# Altium footprint library Flyback Transformers.PcbLib: 66 footprints (part 4 of 5)
Each footprint in its own frame and in the unit in brackets; x right, y up, seen from the top. Pads: shape width x height; smd on the part's side, far side on the other; paste and mask are expansions set on the pad; w line width, h text height; cw(c..) or ccw(c..) is an arc to the next point about the centre after c.
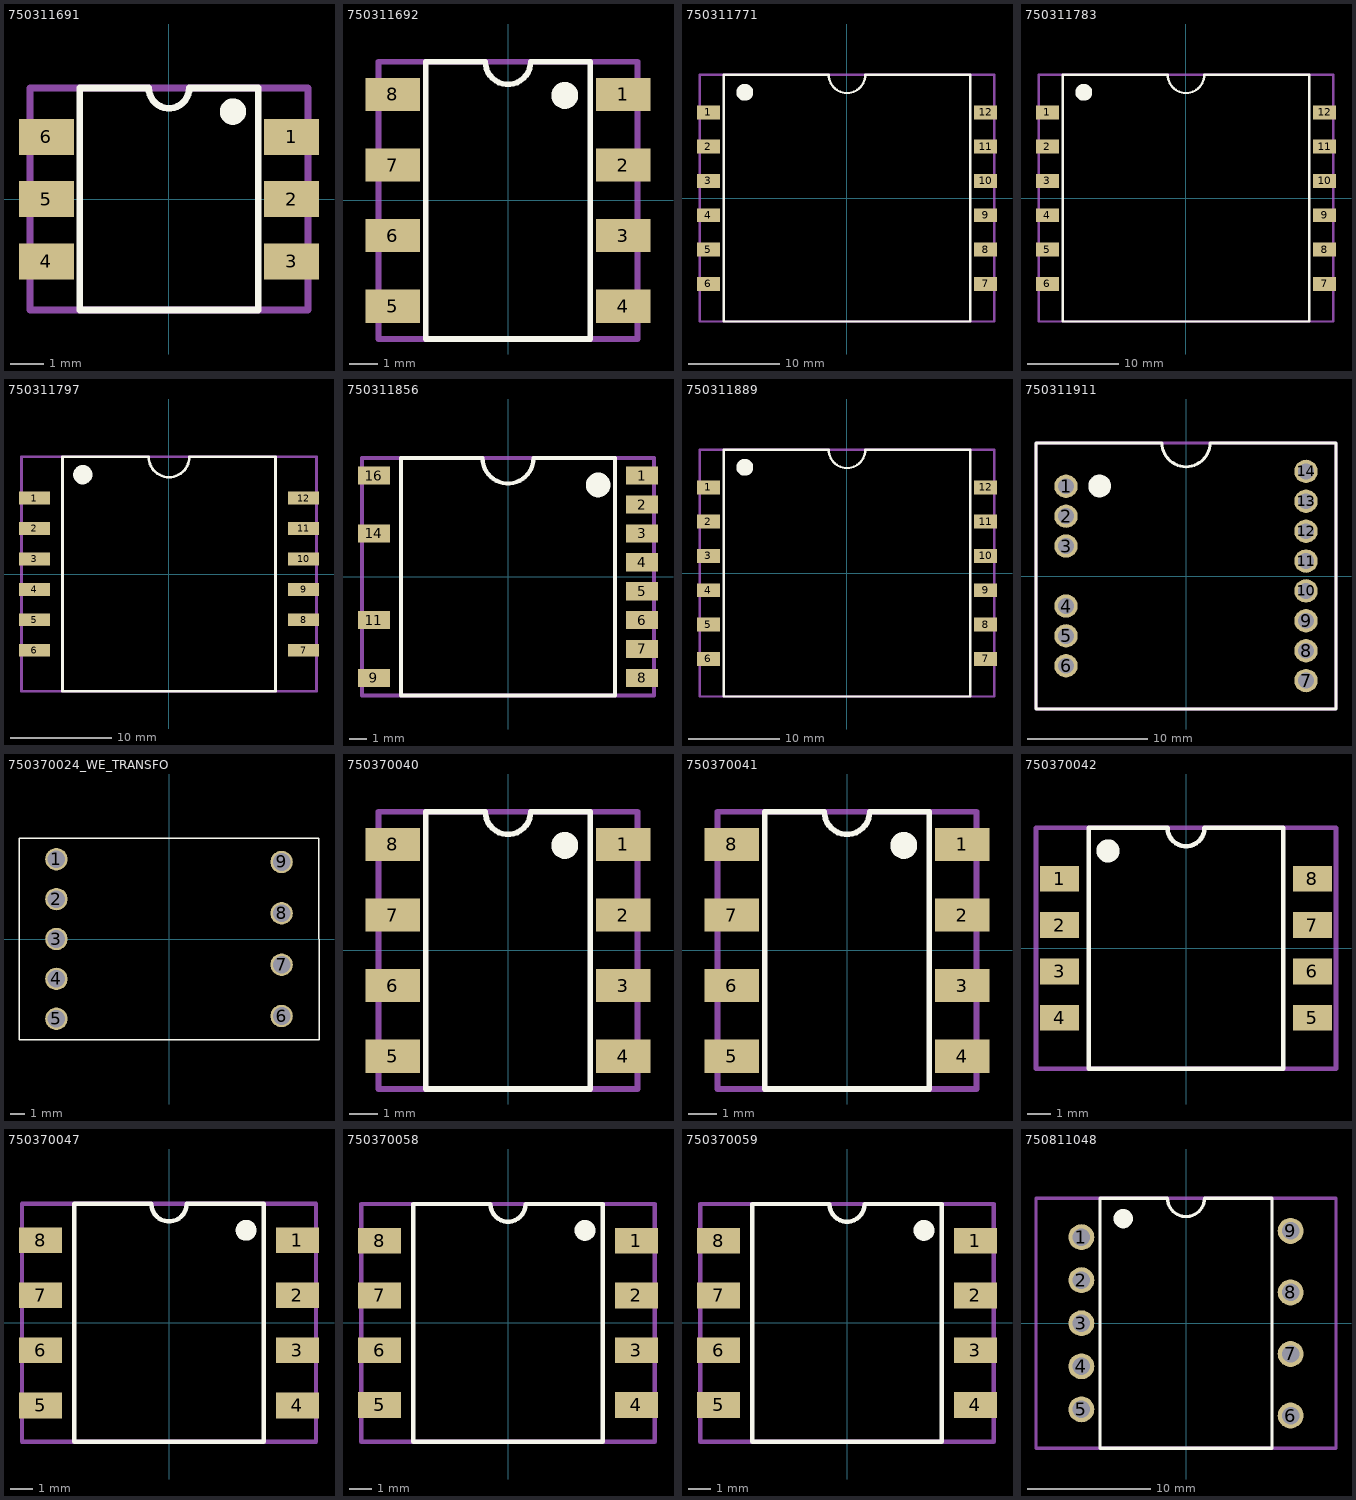
[diagram p3: the footprints below, top view; thin cyan lines are the x and y axes]

## 750311691 [mm] "Flyback Transformer, size EP5"
height 5.59
pads (6):
  rect 1.63x1.07 smd: 1(3.645,1.85) 2(3.645,0) 3(3.645,-1.85) 4(-3.645,-1.85) 5(-3.645,0) 6(-3.645,1.85)
Top Overlay:
  circle w0.5: c1.9,2.6 r0.141
  lines w0.2: -2.65,-3.3 2.65,-3.3 2.65,3.3 0.6,3.3 cw(c0,3.3) -0.6,3.3 -2.65,3.3 -2.65,-3.3
Mechanical 13:
  lines w0.2: -4.13,-3.3 4.13,-3.3 4.13,3.3 -4.13,3.3 -4.13,-3.3
3D body "STEP-750311691-rev1.stp": height 5.1, standoff 0, extent -3.85,-3.075 3.85,3.075

## 750311692 [mm] "Flyback Transformer, size EP7"
height 10.54
pads (8):
  rect 1.91x1.17 smd: 1(4.065,3.735) 2(4.065,1.245) 3(4.065,-1.245) 4(4.065,-3.735) 5(-4.065,-3.735) 6(-4.065,-1.245) 7(-4.065,1.245) 8(-4.065,3.735)
Top Overlay:
  circle w0.5: c2,3.7 r0.224
  lines w0.2: -2.9,-4.89 2.9,-4.89 2.9,4.89 0.8,4.89 cw(c0,4.89) -0.8,4.89 -2.9,4.89 -2.9,-4.89
Mechanical 13:
  lines w0.2: -4.57,-4.89 4.57,-4.89 4.57,4.89 -4.57,4.89 -4.57,-4.89
3D body "STEP-750311692-rev1.stp": height 10.55, standoff 0.01, extent -4.57,-4.89 4.57,4.89

## 750311771 [mm] "Flyback Transformer, size EFD25"
height 13.69
pads (12):
  rect 2.5x1.52 smd: 1(-15.19,9.4) 2(-15.19,5.64) 3(-15.19,1.88) 4(-15.19,-1.88) 5(-15.19,-5.64) 6(-15.19,-9.4) 7(15.19,-9.4) 8(15.19,-5.64) 9(15.19,-1.88) 10(15.19,1.88) 11(15.19,5.64) 12(15.19,9.4)
Top Overlay:
  circle w1: c-11.2,11.6 r0.424
  lines w0.254: -13.5,-13.515 -13.5,13.515 -2,13.515 ccw(c0,13.515) 2,13.515 13.5,13.515 13.5,-13.515 -13.5,-13.515
Mechanical 13:
  lines w0.254: -16.155,-13.515 16.155,-13.515 16.155,13.515 -16.155,13.515 -16.155,-13.515
3D body "STEP-750311771-rev1.stp": height 13.05, standoff 0.05, extent -15.75,-12.5 15.75,12.5

## 750311783 [mm] "Flyback Transformer, size EFD25"
height 13.69
pads (12):
  rect 2.5x1.52 smd: 1(-15.19,9.4) 2(-15.19,5.64) 3(-15.19,1.88) 4(-15.19,-1.88) 5(-15.19,-5.64) 6(-15.19,-9.4) 7(15.19,-9.4) 8(15.19,-5.64) 9(15.19,-1.88) 10(15.19,1.88) 11(15.19,5.64) 12(15.19,9.4)
Top Overlay:
  circle w1: c-11.2,11.6 r0.424
  lines w0.254: -13.5,-13.515 -13.5,13.515 -2,13.515 ccw(c0,13.515) 2,13.515 13.5,13.515 13.5,-13.515 -13.5,-13.515
Mechanical 13:
  lines w0.254: -16.155,-13.515 16.155,-13.515 16.155,13.515 -16.155,13.515 -16.155,-13.515
3D body "STEP-750311783-rev1.stp": height 13.05, standoff 0.05, extent -15.75,-12.5 15.75,12.5

## 750311797 [mm] "Flyback Transformer, size EFD20"
height 11.43
pads (12):
  rect 3.05x1.27 smd: 1(-13.26,7.5) 2(-13.26,4.5) 3(-13.26,1.5) 4(-13.26,-1.5) 5(-13.26,-4.5) 6(-13.26,-7.5) 7(13.26,-7.5) 8(13.26,-4.5) 9(13.26,-1.5) 10(13.26,1.5) 11(13.26,4.5) 12(13.26,7.5)
Top Overlay:
  circle w1: c-8.5,9.8 r0.447
  lines w0.254: -10.5,-11.555 -10.5,11.555 -2,11.555 ccw(c0,11.555) 2,11.555 10.5,11.555 10.5,-11.555 -10.5,-11.555
Mechanical 13:
  lines w0.254: -14.54,-11.555 14.54,-11.555 14.54,11.555 -14.54,11.555 -14.54,-11.555
3D body "STEP-750311797-rev1 (1).stp": height 11.45, standoff 0.02, extent -14.54,-10 14.54,10

## 750311856 [mm] "Flyback Transformer, size EP13"
height 12.7
pads (12):
  rect 1.88x1.07 smd: 1(7.885,5.95) 2(7.885,4.25) 3(7.885,2.55) 4(7.885,0.85) 5(7.885,-0.85) 6(7.885,-2.55) 7(7.885,-4.25) 8(7.885,-5.95) 9(-7.885,-5.95) 11(-7.885,-2.55) 14(-7.885,2.55) 16(-7.885,5.95)
Top Overlay:
  circle w1: c5.3,5.4 r0.224
  lines w0.254: -6.3,-6.985 6.3,-6.985 6.3,6.985 1.5,6.985 cw(c0,6.985) -1.5,6.985 -6.3,6.985 -6.3,-6.985
Mechanical 13:
  lines w0.254: -8.585,-6.985 -8.585,6.985 8.585,6.985 8.585,-6.985 -8.585,-6.985
3D body "STEP-750311856-rev1.stp": height 12.71, standoff 0, extent -8.585,-6.985 8.585,6.985

## 750311889 [mm] "Flyback Transformer, size EFD25"
height 13.69
pads (12):
  rect 2.5x1.52 smd: 1(-15.19,9.4) 2(-15.19,5.64) 3(-15.19,1.88) 4(-15.19,-1.88) 5(-15.19,-5.64) 6(-15.19,-9.4) 7(15.19,-9.4) 8(15.19,-5.64) 9(15.19,-1.88) 10(15.19,1.88) 11(15.19,5.64) 12(15.19,9.4)
Top Overlay:
  circle w1: c-11.2,11.6 r0.424
  lines w0.254: -13.5,-13.515 13.5,-13.515 13.5,13.515 2,13.515 cw(c0,13.515) -2,13.515 -13.5,13.515 -13.5,-13.515
Mechanical 13:
  lines w0.254: -16.155,-13.515 -16.155,13.515 16.155,13.515 16.155,-13.515 -16.155,-13.515
3D body "STEP-750311889-rev1.stp": height 13.3, standoff 0.05, extent -15.75,-12.75 15.75,12.75

## 750311911 [mm] "Flyback Transformer, size EE20/10/6"
height 16
pads (14):
  round 1.95 hole 1.32: 1(-10,7.48) 2(-10,4.99) 3(-10,2.5) 4(-10,-2.5) 5(-10,-4.99) 6(-10,-7.48) 7(10,-8.715) 8(10,-6.225) 9(10,-3.735) 10(10,-1.245) 11(10,1.245) 12(10,3.735) 13(10,6.225) 14(10,8.715)
Top Overlay:
  circle w1: c-7.2,7.5 r0.447
  lines w0.254: -12.5,-11.1 12.5,-11.1 12.5,11.1 2,11.1 cw(c0,11.1) -2,11.1 -12.5,11.1 -12.5,-11.1
Mechanical 13:
  lines w0.254: -12.5,-11.1 12.5,-11.1 12.5,11.1 -12.5,11.1 -12.5,-11.1
3D body "750311911.stp": height 15.4, standoff -3.5, extent -12.4,-10.45 12.4,10.45

## 750370024_WE_TRANSFO [mm]
pads (9):
  round 1.524 hole 1.2: 1(-7.675,5.44) 2(-7.675,2.72) 3(-7.675,0) 4(-7.675,-2.72) 5(-7.675,-5.44) 6(7.675,-5.25) 7(7.675,-1.75) 8(7.675,1.75) 9(7.675,5.25)
Top Overlay:
  lines w0.1: -10.225,-6.86 -10.225,6.86 10.225,6.86 10.225,-6.86 -10.225,-6.86
3D body: height 10.8, standoff 5, extent -7.747,-5.639 -5.74,5.334
3D body: height 10.8, standoff 5, extent 2.553,-5.69 4.559,5.283
3D body: height 9, standoff 4, extent -8.915,-6.426 5.41,6.274
3D body: height 3, standoff 1, extent -10.246,-6.83 10.074,6.886
3D body: height 11, standoff 2, extent -5.651,-4.479 2.349,4.521
3D body: height 4, standoff 3, extent -8.827,-6.35 5.461,6.35
3D body: height 3, standoff 0, extent 2.739,-6.858 5.461,6.858
3D body: height 3, standoff 0, extent -10.215,-6.858 -8.89,6.858
3D body: height 8.5, standoff 0.8, extent -6.318,-3.81 2.54,3.81
3D body: height 1.5, standoff -1.5, extent -8.192,4.911 -7.196,5.909
3D body: height 1.5, standoff -1.5, extent -8.167,2.219 -7.171,3.217
3D body: height 1.5, standoff -1.5, extent -8.167,-0.499 -7.171,0.499
3D body: height 1.5, standoff -1.5, extent -8.167,-3.242 -7.171,-2.244
3D body: height 1.5, standoff -1.5, extent -8.167,-5.96 -7.171,-4.962
3D body: height 1.5, standoff -1.5, extent 7.149,4.734 8.146,5.731
3D body: height 1.5, standoff -1.5, extent 7.175,1.203 8.171,2.201
3D body: height 1.5, standoff -1.5, extent 7.2,-2.277 8.196,-1.279
3D body: height 1.5, standoff -1.5, extent 7.175,-5.807 8.171,-4.81

## 750370040 [mm] "Flyback Transformer, size EP7"
height 10.54
pads (8):
  rect 1.91x1.17 smd: 1(4.065,3.735) 2(4.065,1.245) 3(4.065,-1.245) 4(4.065,-3.735) 5(-4.065,-3.735) 6(-4.065,-1.245) 7(-4.065,1.245) 8(-4.065,3.735)
Top Overlay:
  circle w0.5: c2,3.7 r0.224
  lines w0.2: -2.9,-4.89 2.9,-4.89 2.9,4.89 0.8,4.89 cw(c0,4.89) -0.8,4.89 -2.9,4.89 -2.9,-4.89
Mechanical 13:
  lines w0.2: -4.57,-4.89 4.57,-4.89 4.57,4.89 -4.57,4.89 -4.57,-4.89
3D body "STEP-750370040-rev1.stp": height 10.55, standoff 0.01, extent -4.57,-4.89 4.57,4.89

## 750370041 [mm] "Flyback Transformer, size EP7"
height 10.54
pads (8):
  rect 1.91x1.17 smd: 1(4.065,3.735) 2(4.065,1.245) 3(4.065,-1.245) 4(4.065,-3.735) 5(-4.065,-3.735) 6(-4.065,-1.245) 7(-4.065,1.245) 8(-4.065,3.735)
Top Overlay:
  circle w0.5: c2,3.7 r0.224
  lines w0.2: -2.9,-4.89 2.9,-4.89 2.9,4.89 0.8,4.89 cw(c0,4.89) -0.8,4.89 -2.9,4.89 -2.9,-4.89
Mechanical 13:
  lines w0.2: -4.57,-4.89 4.57,-4.89 4.57,4.89 -4.57,4.89 -4.57,-4.89
3D body "STEP-750370041-rev1.stp": height 10.55, standoff 0.01, extent -4.57,-4.89 4.57,4.89

## 750370042 [mm] "Flyback Transformer, size ER9.5"
height 5.97
pads (8):
  rect 1.7x1.12 smd: 1(-5.46,3) 2(-5.46,1) 3(-5.46,-1) 4(-5.46,-3) 5(5.46,-3) 6(5.46,-1) 7(5.46,1) 8(5.46,3)
Top Overlay:
  circle w0.8: c-3.367,4.204 r0.097
  lines w0.2: -4.2,-5.205 4.2,-5.205 4.2,5.205 0.8,5.205 cw(c0,5.205) -0.8,5.205 -4.2,5.205 -4.2,-5.205
Mechanical 13:
  lines w0.2: -6.475,-5.205 -6.475,5.205 6.475,5.205 6.475,-5.205 -6.475,-5.205
3D body "STEP-750370042-rev1 (1).stp": height 5.97, standoff 0, extent -6.475,-4.75 6.475,4.75

## 750370047 [mm] "Flyback Transformer, size EP7"
height 9.14
pads (8):
  rect 1.96x1.17 smd: 1(5.83,3.75) 2(5.83,1.25) 3(5.83,-1.25) 4(5.83,-3.75) 5(-5.83,-3.75) 6(-5.83,-1.25) 7(-5.83,1.25) 8(-5.83,3.75)
Top Overlay:
  circle w0.5: c3.5,4.2 r0.224
  lines w0.2: -4.3,-5.4 -4.3,5.4 -0.8,5.4 ccw(c0,5.4) 0.8,5.4 4.3,5.4 4.3,-5.4 -4.3,-5.4
Mechanical 13:
  lines w0.2: -6.675,-5.4 -6.675,5.4 6.675,5.4 6.675,-5.4 -6.675,-5.4
3D body "EP7-big.stp": height 9.15, standoff 0.01, extent -6.675,-5.4 6.675,5.4

## 750370058 [mm] "Flyback Transformer, size EP7"
height 9.14
pads (8):
  rect 1.96x1.17 smd: 1(5.84,3.735) 2(5.84,1.245) 3(5.84,-1.245) 4(5.84,-3.735) 5(-5.84,-3.735) 6(-5.84,-1.245) 7(-5.84,1.245) 8(-5.84,3.735)
Top Overlay:
  circle w0.5: c3.5,4.2 r0.224
  lines w0.2: -4.3,-5.4 -4.3,5.4 -0.8,5.4 ccw(c0,5.4) 0.8,5.4 4.3,5.4 4.3,-5.4 -4.3,-5.4
Mechanical 13:
  lines w0.2: -6.675,-5.4 -6.675,5.4 6.675,5.4 6.675,-5.4 -6.675,-5.4
3D body "EP7-big.stp": height 9.15, standoff 0.01, extent -6.675,-5.4 6.675,5.4

## 750370059 [mm] "Flyback Transformer, size EP7"
height 9.14
pads (8):
  rect 1.96x1.17 smd: 1(5.84,3.735) 2(5.84,1.245) 3(5.84,-1.245) 4(5.84,-3.735) 5(-5.84,-3.735) 6(-5.84,-1.245) 7(-5.84,1.245) 8(-5.84,3.735)
Top Overlay:
  circle w0.5: c3.5,4.2 r0.224
  lines w0.2: -4.3,-5.4 -4.3,5.4 -0.8,5.4 ccw(c0,5.4) 0.8,5.4 4.3,5.4 4.3,-5.4 -4.3,-5.4
Mechanical 13:
  lines w0.2: -6.675,-5.4 -6.675,5.4 6.675,5.4 6.675,-5.4 -6.675,-5.4
3D body "EP7-big.stp": height 9.15, standoff 0.01, extent -6.675,-5.4 6.675,5.4

## 750811048 [mm] "Flyback Transformer, size EE16/8/5"
height 16
pads (9):
  round 2.1 hole 1.42: 1(-8.5,7) 2(-8.5,3.5) 3(-8.5,0) 4(-8.5,-3.5) 5(-8.5,-7) 6(8.5,-7.5) 7(8.5,-2.5) 8(8.5,2.5) 9(8.5,7.5)
Top Overlay:
  circle w1: c-5.1,8.5 r0.283
  lines w0.254: -7,-10.16 -7,10.16 -1.5,10.16 ccw(c0,10.16) 1.5,10.16 7,10.16 7,-10.16 -7,-10.16
Mechanical 13:
  lines w0.254: -12.19,-10.16 12.19,-10.16 12.19,10.16 -12.19,10.16 -12.19,-10.16
3D body "750811048.stp": height 14.95, standoff -3.45, extent -11.9,-9.9 11.9,9.9